# Altium footprint library ref-packages.PCBLIB: 1544 footprints (part 45 of 103) (continued)
## QFP64 [mm] (continued)
  rectangle: -7.25,-9.6 -6.75,-7.55
  rectangle: -8.25,-9.6 -7.75,-7.55
  rectangle: -12.6,5.75 -10.55,6.25
  rectangle: -12.6,4.75 -10.55,5.25
  rectangle: -12.6,3.75 -10.55,4.25
  rectangle: -12.6,2.75 -10.55,3.25
  rectangle: -12.6,1.75 -10.55,2.25
  rectangle: -12.6,0.75 -10.55,1.25
  rectangle: -12.6,-0.25 -10.55,0.25
  rectangle: -12.6,-1.25 -10.55,-0.75
  rectangle: -12.6,-2.25 -10.55,-1.75
  rectangle: -12.6,-3.25 -10.55,-2.75
  rectangle: -12.6,-4.25 -10.55,-3.75
  rectangle: -12.6,-5.25 -10.55,-4.75
  rectangle: -12.6,-6.25 -10.55,-5.75
  rectangle: -9.25,-9.6 -8.75,-7.55
  lines w0.051: -10.5,-6.5 -10,-6.5 ; -9.5,-7.5 -9.5,-7
  lines w0.152: -10.5,-6.5 -9.5,-7.5 10.5,-7.5 10.5,7.5 -10.5,7.5 -10.5,-6.5

## QFP64_SOT319 [mm]
pads (64):
  rect 0.6x1.4 smd: 1(-9,-8.5) 2(-8,-8.5) 3(-7,-8.5) 4(-6,-8.5) 5(-5,-8.5) 6(-4,-8.5) 7(-3,-8.5) 8(-2,-8.5) 9(-1,-8.5) 10(0,-8.5) 11(1,-8.5) 12(2,-8.5) 13(3,-8.5) 14(4,-8.5) 15(5,-8.5) 16(6,-8.5) 17(7,-8.5) 18(8,-8.5) 19(9,-8.5) 33(9,8.5) 34(8,8.5) 35(7,8.5) 36(6,8.5) 37(5,8.5) 38(4,8.5) 39(3,8.5) 40(2,8.5) 41(1,8.5) 42(0,8.5) 43(-1,8.5) 44(-2,8.5) 45(-3,8.5) 46(-4,8.5) 47(-5,8.5) 48(-6,8.5) 49(-7,8.5) 50(-8,8.5) 51(-9,8.5)
  rect 1.4x0.6 smd: 20(11.5,-6) 21(11.5,-5) 22(11.5,-4) 23(11.5,-3) 24(11.5,-2) 25(11.5,-1) 26(11.5,0) 27(11.5,1) 28(11.5,2) 29(11.5,3) 30(11.5,4) 31(11.5,5) 32(11.5,6) 52(-11.5,6) 53(-11.5,5) 54(-11.5,4) 55(-11.5,3) 56(-11.5,2) 57(-11.5,1) 58(-11.5,0) 59(-11.5,-1) 60(-11.5,-2) 61(-11.5,-3) 62(-11.5,-4) 63(-11.5,-5) 64(-11.5,-6)
Top Overlay:
  circle w0.203: c-9,-6 r0.4
  lines w0.203: -10.1,-7.1 10.1,-7.1 10.1,7.1 -10.1,7.1 -10.1,-7.1
Mechanical 16:
  rectangle: -9.2,-8.8 -8.8,-7.15
  rectangle: -8.2,-8.8 -7.8,-7.15
  rectangle: -7.2,-8.8 -6.8,-7.15
  rectangle: -6.2,-8.8 -5.8,-7.15
  rectangle: -5.2,-8.8 -4.8,-7.15
  rectangle: -4.2,-8.8 -3.8,-7.15
  rectangle: -3.2,-8.8 -2.8,-7.15
  rectangle: -2.2,-8.8 -1.8,-7.15
  rectangle: -1.2,-8.8 -0.8,-7.15
  rectangle: -0.2,-8.8 0.2,-7.15
  rectangle: 0.8,-8.8 1.2,-7.15
  rectangle: 1.8,-8.8 2.2,-7.15
  rectangle: 2.8,-8.8 3.2,-7.15
  rectangle: 3.8,-8.8 4.2,-7.15
  rectangle: 4.8,-8.8 5.2,-7.15
  rectangle: 5.8,-8.8 6.2,-7.15
  rectangle: 6.8,-8.8 7.2,-7.15
  rectangle: 7.8,-8.8 8.2,-7.15
  rectangle: 8.8,-8.8 9.2,-7.15
  rectangle: 10.15,-6.2 11.8,-5.8
  rectangle: 10.15,-5.2 11.8,-4.8
  rectangle: 10.15,-4.2 11.8,-3.8
  rectangle: 10.15,-3.2 11.8,-2.8
  rectangle: 10.15,-2.2 11.8,-1.8
  rectangle: 10.15,-1.2 11.8,-0.8
  rectangle: 10.15,-0.2 11.8,0.2
  rectangle: 10.15,0.8 11.8,1.2
  rectangle: 10.15,1.8 11.8,2.2
  rectangle: 10.15,2.8 11.8,3.2
  rectangle: 10.15,3.8 11.8,4.2
  rectangle: 10.15,4.8 11.8,5.2
  rectangle: 10.15,5.8 11.8,6.2
  rectangle: 8.8,7.15 9.2,8.8
  rectangle: 7.8,7.15 8.2,8.8
  rectangle: 6.8,7.15 7.2,8.8
  rectangle: 5.8,7.15 6.2,8.8
  rectangle: 4.8,7.15 5.2,8.8
  rectangle: 3.8,7.15 4.2,8.8
  rectangle: 2.8,7.15 3.2,8.8
  rectangle: 1.8,7.15 2.2,8.8
  rectangle: 0.8,7.15 1.2,8.8
  rectangle: -0.2,7.15 0.2,8.8
  rectangle: -1.2,7.15 -0.8,8.8
  rectangle: -2.2,7.15 -1.8,8.8
  rectangle: -3.2,7.15 -2.8,8.8
  rectangle: -4.2,7.15 -3.8,8.8
  rectangle: -5.2,7.15 -4.8,8.8
  rectangle: -6.2,7.15 -5.8,8.8
  rectangle: -7.2,7.15 -6.8,8.8
  rectangle: -8.2,7.15 -7.8,8.8
  rectangle: -9.2,7.15 -8.8,8.8
  rectangle: -11.8,5.8 -10.15,6.2
  rectangle: -11.8,4.8 -10.15,5.2
  rectangle: -11.8,3.8 -10.15,4.2
  rectangle: -11.8,2.8 -10.15,3.2
  rectangle: -11.8,1.8 -10.15,2.2
  rectangle: -11.8,0.8 -10.15,1.2
  rectangle: -11.8,-0.2 -10.15,0.2
  rectangle: -11.8,-1.2 -10.15,-0.8
  rectangle: -11.8,-2.2 -10.15,-1.8
  rectangle: -11.8,-3.2 -10.15,-2.8
  rectangle: -11.8,-4.2 -10.15,-3.8
  rectangle: -11.8,-5.2 -10.15,-4.8
  rectangle: -11.8,-6.2 -10.15,-5.8

## QFP64_SOT393 [mm]
pads (64):
  rect 0.4x1.4 smd: 1(-6,-8.125) 2(-5.2,-8.125) 3(-4.4,-8.125) 4(-3.6,-8.125) 5(-2.8,-8.125) 6(-2,-8.125) 7(-1.2,-8.125) 8(-0.4,-8.125) 9(0.4,-8.125) 10(1.2,-8.125) 11(2,-8.125) 12(2.8,-8.125) 13(3.6,-8.125) 14(4.4,-8.125) 15(5.2,-8.125) 16(6,-8.125) 33(6,8.125) 34(5.2,8.125) 35(4.4,8.125) 36(3.6,8.125) 37(2.8,8.125) 38(2,8.125) 39(1.2,8.125) 40(0.4,8.125) 41(-0.4,8.125) 42(-1.2,8.125) 43(-2,8.125) 44(-2.8,8.125) 45(-3.6,8.125) 46(-4.4,8.125) 47(-5.2,8.125) 48(-6,8.125)
  rect 1.4x0.4 smd: 17(8.125,-6) 18(8.125,-5.2) 19(8.125,-4.4) 20(8.125,-3.6) 21(8.125,-2.8) 22(8.125,-2) 23(8.125,-1.2) 24(8.125,-0.4) 25(8.125,0.4) 26(8.125,1.2) 27(8.125,2) 28(8.125,2.8) 29(8.125,3.6) 30(8.125,4.4) 31(8.125,5.2) 32(8.125,6) 49(-8.125,6) 50(-8.125,5.2) 51(-8.125,4.4) 52(-8.125,3.6) 53(-8.125,2.8) 54(-8.125,2) 55(-8.125,1.2) 56(-8.125,0.4) 57(-8.125,-0.4) 58(-8.125,-1.2) 59(-8.125,-2) 60(-8.125,-2.8) 61(-8.125,-3.6) 62(-8.125,-4.4) 63(-8.125,-5.2) 64(-8.125,-6)
Top Overlay:
  circle w0.203: c-6,-6 r0.4
  lines w0.203: -7,-7 7,-7 7,7 -7,7 -7,-7
Mechanical 16:
  rectangle: -6.15,-8.6 -5.85,-7.075
  rectangle: -5.35,-8.6 -5.05,-7.075
  rectangle: -4.55,-8.6 -4.25,-7.075
  rectangle: -3.75,-8.6 -3.45,-7.075
  rectangle: -2.95,-8.6 -2.65,-7.075
  rectangle: -2.15,-8.6 -1.85,-7.075
  rectangle: -1.35,-8.6 -1.05,-7.075
  rectangle: -0.55,-8.6 -0.25,-7.075
  rectangle: 0.25,-8.6 0.55,-7.075
  rectangle: 1.05,-8.6 1.35,-7.075
  rectangle: 1.85,-8.6 2.15,-7.075
  rectangle: 2.65,-8.6 2.95,-7.075
  rectangle: 3.45,-8.6 3.75,-7.075
  rectangle: 4.25,-8.6 4.55,-7.075
  rectangle: 5.05,-8.6 5.35,-7.075
  rectangle: 5.85,-8.6 6.15,-7.075
  rectangle: 7.075,-6.15 8.6,-5.85
  rectangle: 7.075,-5.35 8.6,-5.05
  rectangle: 7.075,-4.55 8.6,-4.25
  rectangle: 7.075,-3.75 8.6,-3.45
  rectangle: 7.075,-2.95 8.6,-2.65
  rectangle: 7.075,-2.15 8.6,-1.85
  rectangle: 7.075,-1.35 8.6,-1.05
  rectangle: 7.075,-0.55 8.6,-0.25
  rectangle: 7.075,0.25 8.6,0.55
  rectangle: 7.075,1.05 8.6,1.35
  rectangle: 7.075,1.85 8.6,2.15
  rectangle: 7.075,2.65 8.6,2.95
  rectangle: 7.075,3.45 8.6,3.75
  rectangle: 7.075,4.25 8.6,4.55
  rectangle: 7.075,5.05 8.6,5.35
  rectangle: 7.075,5.85 8.6,6.15
  rectangle: 5.85,7.075 6.15,8.6
  rectangle: 5.05,7.075 5.35,8.6
  rectangle: 4.25,7.075 4.55,8.6
  rectangle: 3.45,7.075 3.75,8.6
  rectangle: 2.65,7.075 2.95,8.6
  rectangle: 1.85,7.075 2.15,8.6
  rectangle: 1.05,7.075 1.35,8.6
  rectangle: 0.25,7.075 0.55,8.6
  rectangle: -0.55,7.075 -0.25,8.6
  rectangle: -1.35,7.075 -1.05,8.6
  rectangle: -2.15,7.075 -1.85,8.6
  rectangle: -2.95,7.075 -2.65,8.6
  rectangle: -3.75,7.075 -3.45,8.6
  rectangle: -4.55,7.075 -4.25,8.6
  rectangle: -5.35,7.075 -5.05,8.6
  rectangle: -6.15,7.075 -5.85,8.6
  rectangle: -8.6,5.85 -7.075,6.15
  rectangle: -8.6,5.05 -7.075,5.35
  rectangle: -8.6,4.25 -7.075,4.55
  rectangle: -8.6,3.45 -7.075,3.75
  rectangle: -8.6,2.65 -7.075,2.95
  rectangle: -8.6,1.85 -7.075,2.15
  rectangle: -8.6,1.05 -7.075,1.35
  rectangle: -8.6,0.25 -7.075,0.55
  rectangle: -8.6,-0.55 -7.075,-0.25
  rectangle: -8.6,-1.35 -7.075,-1.05
  rectangle: -8.6,-2.15 -7.075,-1.85
  rectangle: -8.6,-2.95 -7.075,-2.65
  rectangle: -8.6,-3.75 -7.075,-3.45
  rectangle: -8.6,-4.55 -7.075,-4.25
  rectangle: -8.6,-5.35 -7.075,-5.05
  rectangle: -8.6,-6.15 -7.075,-5.85

## QFP80 [mm]
pads (80):
  rect 0.35x1.9 smd: 1(-8.8,-7.53) 2(-8,-7.53) 3(-7.2,-7.53) 4(-6.4,-7.53) 5(-5.6,-7.53) 6(-4.8,-7.53) 7(-4,-7.53) 8(-3.2,-7.53) 9(-2.4,-7.53) 10(-1.6,-7.53) 11(-0.8,-7.53) 12(0,-7.53) 13(0.8,-7.53) 14(1.6,-7.53) 15(2.4,-7.53) 16(3.2,-7.53) 17(4,-7.53) 18(4.8,-7.53) 19(5.6,-7.53) 20(6.4,-7.53) 21(7.2,-7.53) 22(8,-7.53) 23(8.8,-7.53) 24(9.6,-7.53) 41(9.6,8.47) 42(8.8,8.47) 43(8,8.47) 44(7.2,8.47) 45(6.4,8.47) 46(5.6,8.47) 47(4.8,8.47) 48(4,8.47) 49(3.2,8.47) 50(2.4,8.47) 51(1.6,8.47) 52(0.8,8.47) 53(0,8.47) 54(-0.8,8.47) 55(-1.6,8.47) 56(-2.4,8.47) 57(-3.2,8.47) 58(-4,8.47) 59(-4.8,8.47) 60(-5.6,8.47) 61(-6.4,8.47) 62(-7.2,8.47) 63(-8,8.47) 64(-8.8,8.47)
  rect 1.9x0.35 smd: 25(11.4,-5.53) 26(11.4,-4.73) 27(11.4,-3.93) 28(11.4,-3.13) 29(11.4,-2.33) 30(11.4,-1.53) 31(11.4,-0.73) 32(11.4,0.07) 33(11.4,0.87) 34(11.4,1.67) 35(11.4,2.47) 36(11.4,3.27) 37(11.4,4.07) 38(11.4,4.87) 39(11.4,5.67) 40(11.4,6.47) 65(-10.6,6.47) 66(-10.6,5.67) 67(-10.6,4.87) 68(-10.6,4.07) 69(-10.6,3.27) 70(-10.6,2.47) 71(-10.6,1.67) 72(-10.6,0.87) 73(-10.6,0.07) 74(-10.6,-0.73) 75(-10.6,-1.53) 76(-10.6,-2.33) 77(-10.6,-3.13) 78(-10.6,-3.93) 79(-10.6,-4.73) 80(-10.6,-5.53)
Top Overlay:
  circle w0.152: c-7.06,-3.92 r1
  rectangle: -8.975,7.52 -8.625,9.42
  rectangle: 9.425,-8.48 9.775,-6.58
  rectangle: -8.175,7.52 -7.825,9.42
  rectangle: -7.375,7.52 -7.025,9.42
  rectangle: -6.575,7.52 -6.225,9.42
  rectangle: -5.775,7.52 -5.425,9.42
  rectangle: -4.975,7.52 -4.625,9.42
  rectangle: -4.175,7.52 -3.825,9.42
  rectangle: -3.375,7.52 -3.025,9.42
  rectangle: -2.575,7.52 -2.225,9.42
  rectangle: -1.775,7.52 -1.425,9.42
  rectangle: -0.975,7.52 -0.625,9.42
  rectangle: -0.175,7.52 0.175,9.42
  rectangle: 0.625,7.52 0.975,9.42
  rectangle: 1.425,7.52 1.775,9.42
  rectangle: 2.225,7.52 2.575,9.42
  rectangle: 3.025,7.52 3.375,9.42
  rectangle: 3.825,7.52 4.175,9.42
  rectangle: 4.625,7.52 4.975,9.42
  rectangle: 5.425,7.52 5.775,9.42
  rectangle: 6.225,7.52 6.575,9.42
  rectangle: 7.025,7.52 7.375,9.42
  rectangle: 7.825,7.52 8.175,9.42
  rectangle: 8.625,7.52 8.975,9.42
  rectangle: 9.425,7.52 9.775,9.42
  rectangle: -8.975,-8.48 -8.625,-6.58
  rectangle: -8.175,-8.48 -7.825,-6.58
  rectangle: -7.375,-8.48 -7.025,-6.58
  rectangle: -6.575,-8.48 -6.225,-6.58
  rectangle: -5.775,-8.48 -5.425,-6.58
  rectangle: -4.975,-8.48 -4.625,-6.58
  rectangle: -4.175,-8.48 -3.825,-6.58
  rectangle: -3.375,-8.48 -3.025,-6.58
  rectangle: -2.575,-8.48 -2.225,-6.58
  rectangle: -1.775,-8.48 -1.425,-6.58
  rectangle: -0.975,-8.48 -0.625,-6.58
  rectangle: -0.175,-8.48 0.175,-6.58
  rectangle: 0.625,-8.48 0.975,-6.58
  rectangle: 1.425,-8.48 1.775,-6.58
  rectangle: 2.225,-8.48 2.575,-6.58
  rectangle: 3.825,-8.48 4.175,-6.58
  rectangle: 3.025,-8.48 3.375,-6.58
  rectangle: 4.625,-8.48 4.975,-6.58
  rectangle: 5.425,-8.48 5.775,-6.58
  rectangle: 6.225,-8.48 6.575,-6.58
  rectangle: 7.025,-8.48 7.375,-6.58
  rectangle: 7.825,-8.48 8.175,-6.58
  rectangle: 8.625,-8.48 8.975,-6.58
  rectangle: 10.45,-0.105 12.35,0.245
  rectangle: -11.55,-5.705 -9.65,-5.355
  rectangle: 10.45,0.695 12.35,1.045
  rectangle: 10.45,1.495 12.35,1.845
  rectangle: 10.45,2.295 12.35,2.645
  rectangle: 10.45,3.095 12.35,3.445
  rectangle: 10.45,3.895 12.35,4.245
  rectangle: 10.45,4.695 12.35,5.045
  rectangle: 10.45,5.495 12.35,5.845
  rectangle: 10.45,6.295 12.35,6.645
  rectangle: 10.45,-0.905 12.35,-0.555
  rectangle: 10.45,-1.705 12.35,-1.355
  rectangle: 10.45,-2.505 12.35,-2.155
  rectangle: 10.45,-3.305 12.35,-2.955
  rectangle: 10.45,-4.105 12.35,-3.755
  rectangle: 10.45,-4.905 12.35,-4.555
  rectangle: 10.45,-5.705 12.35,-5.355
  rectangle: -11.55,6.295 -9.65,6.645
  rectangle: -11.55,5.495 -9.65,5.845
  rectangle: -11.55,4.695 -9.65,5.045
  rectangle: -11.55,3.895 -9.65,4.245
  rectangle: -11.55,3.095 -9.65,3.445
  rectangle: -11.55,2.295 -9.65,2.645
  rectangle: -11.55,1.495 -9.65,1.845
  rectangle: -11.55,0.695 -9.65,1.045
  rectangle: -11.55,-0.105 -9.65,0.245
  rectangle: -11.55,-0.905 -9.65,-0.555
  rectangle: -11.55,-1.705 -9.65,-1.355
  rectangle: -11.55,-2.505 -9.65,-2.155
  rectangle: -11.55,-3.305 -9.65,-2.955
  rectangle: -11.55,-4.105 -9.65,-3.755
  rectangle: -11.55,-4.905 -9.65,-4.555
  lines w0.152: -9.2,5.47 -9.2,5.67 ; -9.6,-5.93 -9,-6.53 ; -9.6,-5.93 -9.6,6.87 ; -9.6,-5.93 -9.2,-5.73 ; -9.6,6.87 -9,7.47 ; -9.6,6.87 -9.2,6.67 ; -9.2,-5.73 -8.8,-6.13 ; -9.2,-5.73 -9.2,5.67 ; -9.2,5.67 -9.2,6.67 ; -9.2,6.67 -8.8,7.07 ; -9,-6.53 9.8,-6.53 ; -9,-6.53 -8.8,-6.13 ; -9,7.47 9.8,7.47 ; -9,7.47 -8.8,7.07 ; -8.8,-6.13 9.6,-6.13 ; -8.8,7.07 9.6,7.07 ; 9.6,-6.13 10,-5.73 ; 9.6,-6.13 9.8,-6.53 ; 9.6,7.07 10,6.67 ; 9.6,7.07 9.8,7.47 ; 9.8,-6.53 10.4,-5.93 ; 9.8,7.47 10.4,6.87 ; 10,-5.73 10,6.67 ; 10,-5.73 10.4,-5.93 ; 10,6.67 10.4,6.87 ; 10.4,-5.93 10.4,6.87

## QFP80-841 [mm]
pads (80):
  rect 1.2x0.4 smd: 1(-8.3,6.175) 2(-8.3,5.525) 3(-8.3,4.875) 4(-8.3,4.225) 5(-8.3,3.575) 6(-8.3,2.925) 7(-8.3,2.275) 8(-8.3,1.625) 9(-8.3,0.975) 10(-8.3,0.325) 11(-8.3,-0.325) 12(-8.3,-0.975) 13(-8.3,-1.625) 14(-8.3,-2.275) 15(-8.3,-2.925) 16(-8.3,-3.575) 17(-8.3,-4.225) 18(-8.3,-4.875) 19(-8.3,-5.525) 20(-8.3,-6.175) 41(8.3,-6.175) 42(8.3,-5.525) 43(8.3,-4.875) 44(8.3,-4.225) 45(8.3,-3.575) 46(8.3,-2.925) 47(8.3,-2.275) 48(8.3,-1.625) 49(8.3,-0.975) 50(8.3,-0.325) 51(8.3,0.325) 52(8.3,0.975) 53(8.3,1.625) 54(8.3,2.275) 55(8.3,2.925) 56(8.3,3.575) 57(8.3,4.225) 58(8.3,4.875) 59(8.3,5.525) 60(8.3,6.175)
  rect 0.4x1.2 smd: 21(-6.175,-8.3) 22(-5.525,-8.3) 23(-4.875,-8.3) 24(-4.225,-8.3) 25(-3.575,-8.3) 26(-2.925,-8.3) 27(-2.275,-8.3) 28(-1.625,-8.3) 29(-0.975,-8.3) 30(-0.325,-8.3) 31(0.325,-8.3) 32(0.975,-8.3) 33(1.625,-8.3) 34(2.275,-8.3) 35(2.925,-8.3) 36(3.575,-8.3) 37(4.225,-8.3) 38(4.875,-8.3) 39(5.525,-8.3) 40(6.175,-8.3) 61(6.175,8.3) 62(5.525,8.3) 63(4.875,8.3) 64(4.225,8.3) 65(3.575,8.3) 66(2.925,8.3) 67(2.275,8.3) 68(1.625,8.3) 69(0.975,8.3) 70(0.325,8.3) 71(-0.325,8.3) 72(-0.975,8.3) 73(-1.625,8.3) 74(-2.275,8.3) 75(-2.925,8.3) 76(-3.575,8.3) 77(-4.225,8.3) 78(-4.875,8.3) 79(-5.525,8.3) 80(-6.175,8.3)
Top Overlay:
  circle w0.152: c-6.15,6.1 r0.354
  lines w0.152: -6.98,-6.98 6.98,-6.98 6.98,6.98 -6.43,6.98 -6.98,6.43 -6.98,-6.98
Mechanical 16:
  rectangle: -8.7,6 -7.02,6.35
  rectangle: -8.7,5.35 -7.02,5.7
  rectangle: -8.7,4.7 -7.02,5.05
  rectangle: -8.7,4.05 -7.02,4.4
  rectangle: -8.7,3.4 -7.02,3.75
  rectangle: -8.7,2.75 -7.02,3.1
  rectangle: -8.7,2.1 -7.02,2.45
  rectangle: -8.7,1.45 -7.02,1.8
  rectangle: -8.7,0.8 -7.02,1.15
  rectangle: -8.7,0.15 -7.02,0.5
  rectangle: -8.7,-0.5 -7.02,-0.15
  rectangle: -8.7,-1.15 -7.02,-0.8
  rectangle: -8.7,-1.8 -7.02,-1.45
  rectangle: -8.7,-2.45 -7.02,-2.1
  rectangle: -8.7,-3.1 -7.02,-2.75
  rectangle: -8.7,-3.75 -7.02,-3.4
  rectangle: -8.7,-4.4 -7.02,-4.05
  rectangle: -8.7,-5.05 -7.02,-4.7
  rectangle: -8.7,-5.7 -7.02,-5.35
  rectangle: -8.7,-6.35 -7.02,-6
  rectangle: -6.35,-8.7 -6,-7.02
  rectangle: -5.7,-8.7 -5.35,-7.02
  rectangle: -5.05,-8.7 -4.7,-7.02
  rectangle: -4.4,-8.7 -4.05,-7.02
  rectangle: -3.75,-8.7 -3.4,-7.02
  rectangle: -3.1,-8.7 -2.75,-7.02
  rectangle: -2.45,-8.7 -2.1,-7.02
  rectangle: -1.8,-8.7 -1.45,-7.02
  rectangle: -1.15,-8.7 -0.8,-7.02
  rectangle: -0.5,-8.7 -0.15,-7.02
  rectangle: 0.15,-8.7 0.5,-7.02
  rectangle: 0.8,-8.7 1.15,-7.02
  rectangle: 1.45,-8.7 1.8,-7.02
  rectangle: 2.1,-8.7 2.45,-7.02
  rectangle: 2.75,-8.7 3.1,-7.02
  rectangle: 3.4,-8.7 3.75,-7.02
  rectangle: 4.05,-8.7 4.4,-7.02
  rectangle: 4.7,-8.7 5.05,-7.02
  rectangle: 5.35,-8.7 5.7,-7.02
  rectangle: 6,-8.7 6.35,-7.02
  rectangle: 7.02,-6.35 8.7,-6
  rectangle: 7.02,-5.7 8.7,-5.35
  rectangle: 7.02,-5.05 8.7,-4.7
  rectangle: 7.02,-4.4 8.7,-4.05
  rectangle: 7.02,-3.75 8.7,-3.4
  rectangle: 7.02,-3.1 8.7,-2.75
  rectangle: 7.02,-2.45 8.7,-2.1
  rectangle: 7.02,-1.8 8.7,-1.45
  rectangle: 7.02,-1.15 8.7,-0.8
  rectangle: 7.02,-0.5 8.7,-0.15
  rectangle: 7.02,0.15 8.7,0.5
  rectangle: 7.02,0.8 8.7,1.15
  rectangle: 7.02,1.45 8.7,1.8
  rectangle: 7.02,2.1 8.7,2.45
  rectangle: 7.02,2.75 8.7,3.1
  rectangle: 7.02,3.4 8.7,3.75
  rectangle: 7.02,4.05 8.7,4.4
  rectangle: 7.02,4.7 8.7,5.05
  rectangle: 7.02,5.35 8.7,5.7
  rectangle: 7.02,6 8.7,6.35
  rectangle: 6,7.02 6.35,8.7
  rectangle: 5.35,7.02 5.7,8.7
  rectangle: 4.7,7.02 5.05,8.7
  rectangle: 4.05,7.02 4.4,8.7
  rectangle: 3.4,7.02 3.75,8.7
  rectangle: 2.75,7.02 3.1,8.7
  rectangle: 2.1,7.02 2.45,8.7
  rectangle: 1.45,7.02 1.8,8.7
  rectangle: 0.8,7.02 1.15,8.7
  rectangle: 0.15,7.02 0.5,8.7
  rectangle: -0.5,7.02 -0.15,8.7
  rectangle: -1.15,7.02 -0.8,8.7
  rectangle: -1.8,7.02 -1.45,8.7
  rectangle: -2.45,7.02 -2.1,8.7
  rectangle: -3.1,7.02 -2.75,8.7
  rectangle: -3.75,7.02 -3.4,8.7
  rectangle: -4.4,7.02 -4.05,8.7
  rectangle: -5.05,7.02 -4.7,8.7
  rectangle: -5.7,7.02 -5.35,8.7
  rectangle: -6.35,7.02 -6,8.7

## QFP80_SOT310-1 [mm]
pads (80):
  rect 0.4x1.4 smd: 1(-9.2,-8.2) 2(-8.4,-8.2) 3(-7.6,-8.2) 4(-6.8,-8.2) 5(-6,-8.2) 6(-5.2,-8.2) 7(-4.4,-8.2) 8(-3.6,-8.2) 9(-2.8,-8.2) 10(-2,-8.2) 11(-1.2,-8.2) 12(-0.4,-8.2) 13(0.4,-8.2) 14(1.2,-8.2) 15(2,-8.2) 16(2.8,-8.2) 17(3.6,-8.2) 18(4.4,-8.2) 19(5.2,-8.2) 20(6,-8.2) 21(6.8,-8.2) 22(7.6,-8.2) 23(8.4,-8.2) 24(9.2,-8.2) 41(9.2,8.2) 42(8.4,8.2) 43(7.6,8.2) 44(6.8,8.2) 45(6,8.2) 46(5.2,8.2) 47(4.4,8.2) 48(3.6,8.2) 49(2.8,8.2) 50(2,8.2) 51(1.2,8.2) 52(0.4,8.2) 53(-0.4,8.2) 54(-1.2,8.2) 55(-2,8.2) 56(-2.8,8.2) 57(-3.6,8.2) 58(-4.4,8.2) 59(-5.2,8.2) 60(-6,8.2) 61(-6.8,8.2) 62(-7.6,8.2) 63(-8.4,8.2) 64(-9.2,8.2)
  rect 1.4x0.4 smd: 25(11.1,-6) 26(11.1,-5.2) 27(11.1,-4.4) 28(11.1,-3.6) 29(11.1,-2.8) 30(11.1,-2) 31(11.1,-1.2) 32(11.1,-0.4) 33(11.1,0.4) 34(11.1,1.2) 35(11.1,2) 36(11.1,2.8) 37(11.1,3.6) 38(11.1,4.4) 39(11.1,5.2) 40(11.1,6) 65(-11.1,6) 66(-11.1,5.2) 67(-11.1,4.4) 68(-11.1,3.6) 69(-11.1,2.8) 70(-11.1,2) 71(-11.1,1.2) 72(-11.1,0.4) 73(-11.1,-0.4) 74(-11.1,-1.2) 75(-11.1,-2) 76(-11.1,-2.8) 77(-11.1,-3.6) 78(-11.1,-4.4) 79(-11.1,-5.2) 80(-11.1,-6)
Top Overlay:
  circle w0.203: c-9.2,-6 r0.4
  lines w0.203: -10,-7 10,-7 10,7 -10,7 -10,-7
Mechanical 16:
  rectangle: -9.35,-8.65 -9.05,-7.05
  rectangle: -8.55,-8.65 -8.25,-7.05
  rectangle: -7.75,-8.65 -7.45,-7.05
  rectangle: -6.95,-8.65 -6.65,-7.05
  rectangle: -6.15,-8.65 -5.85,-7.05
  rectangle: -5.35,-8.65 -5.05,-7.05
  rectangle: -4.55,-8.65 -4.25,-7.05
  rectangle: -3.75,-8.65 -3.45,-7.05
  rectangle: -2.95,-8.65 -2.65,-7.05
  rectangle: -2.15,-8.65 -1.85,-7.05
  rectangle: -1.35,-8.65 -1.05,-7.05
  rectangle: -0.55,-8.65 -0.25,-7.05
  rectangle: 0.25,-8.65 0.55,-7.05
  rectangle: 1.05,-8.65 1.35,-7.05
  rectangle: 1.85,-8.65 2.15,-7.05
  rectangle: 2.65,-8.65 2.95,-7.05
  rectangle: 3.45,-8.65 3.75,-7.05
  rectangle: 4.25,-8.65 4.55,-7.05
  rectangle: 5.05,-8.65 5.35,-7.05
  rectangle: 5.85,-8.65 6.15,-7.05
  rectangle: 6.65,-8.65 6.95,-7.05
  rectangle: 7.45,-8.65 7.75,-7.05
  rectangle: 8.25,-8.65 8.55,-7.05
  rectangle: 9.05,-8.65 9.35,-7.05
  rectangle: 9.95,-6.15 11.55,-5.85
  rectangle: 9.95,-5.35 11.55,-5.05
  rectangle: 9.95,-4.55 11.55,-4.25
  rectangle: 9.95,-3.75 11.55,-3.45
  rectangle: 9.95,-2.95 11.55,-2.65
  rectangle: 9.95,-2.15 11.55,-1.85
  rectangle: 9.95,-1.35 11.55,-1.05
  rectangle: 9.95,-0.55 11.55,-0.25
  rectangle: 9.95,0.25 11.55,0.55
  rectangle: 9.95,1.05 11.55,1.35
  rectangle: 9.95,1.85 11.55,2.15
  rectangle: 9.95,2.65 11.55,2.95
  rectangle: 9.95,3.45 11.55,3.75
  rectangle: 9.95,4.25 11.55,4.55
  rectangle: 9.95,5.05 11.55,5.35
  rectangle: 9.95,5.85 11.55,6.15
  rectangle: 9.05,7.05 9.35,8.65
  rectangle: 8.25,7.05 8.55,8.65
  rectangle: 7.45,7.05 7.75,8.65
  rectangle: 6.65,7.05 6.95,8.65
  rectangle: 5.85,7.05 6.15,8.65
  rectangle: 5.05,7.05 5.35,8.65
  rectangle: 4.25,7.05 4.55,8.65
  rectangle: 3.45,7.05 3.75,8.65
  rectangle: 2.65,7.05 2.95,8.65
  rectangle: 1.85,7.05 2.15,8.65
  rectangle: 1.05,7.05 1.35,8.65
  rectangle: 0.25,7.05 0.55,8.65
  rectangle: -0.55,7.05 -0.25,8.65
  rectangle: -1.35,7.05 -1.05,8.65
  rectangle: -2.15,7.05 -1.85,8.65
  rectangle: -2.95,7.05 -2.65,8.65
  rectangle: -3.75,7.05 -3.45,8.65
  rectangle: -4.55,7.05 -4.25,8.65
  rectangle: -5.35,7.05 -5.05,8.65
  rectangle: -6.15,7.05 -5.85,8.65
  rectangle: -6.95,7.05 -6.65,8.65
  rectangle: -7.75,7.05 -7.45,8.65
  rectangle: -8.55,7.05 -8.25,8.65
  rectangle: -9.35,7.05 -9.05,8.65
  rectangle: -11.55,5.85 -9.95,6.15
  rectangle: -11.55,5.05 -9.95,5.35
  rectangle: -11.55,4.25 -9.95,4.55
  rectangle: -11.55,3.45 -9.95,3.75
  rectangle: -11.55,2.65 -9.95,2.95
  rectangle: -11.55,1.85 -9.95,2.15
  rectangle: -11.55,1.05 -9.95,1.35
  rectangle: -11.55,0.25 -9.95,0.55
  rectangle: -11.55,-0.55 -9.95,-0.25
  rectangle: -11.55,-1.35 -9.95,-1.05
  rectangle: -11.55,-2.15 -9.95,-1.85
  rectangle: -11.55,-2.95 -9.95,-2.65
  rectangle: -11.55,-3.75 -9.95,-3.45
  rectangle: -11.55,-4.55 -9.95,-4.25
  rectangle: -11.55,-5.35 -9.95,-5.05
  rectangle: -11.55,-6.15 -9.95,-5.85

## QFP80_SOT318 [mm]
pads (80):
  rect 0.4x1.4 smd: 1(-9.2,-8.5) 2(-8.4,-8.5) 3(-7.6,-8.5) 4(-6.8,-8.5) 5(-6,-8.5) 6(-5.2,-8.5) 7(-4.4,-8.5) 8(-3.6,-8.5) 9(-2.8,-8.5) 10(-2,-8.5) 11(-1.2,-8.5) 12(-0.4,-8.5) 13(0.4,-8.5) 14(1.2,-8.5) 15(2,-8.5) 16(2.8,-8.5) 17(3.6,-8.5) 18(4.4,-8.5) 19(5.2,-8.5) 20(6,-8.5) 21(6.8,-8.5) 22(7.6,-8.5) 23(8.4,-8.5) 24(9.2,-8.5) 41(9.2,8.5) 42(8.4,8.5) 43(7.6,8.5) 44(6.8,8.5) 45(6,8.5) 46(5.2,8.5) 47(4.4,8.5) 48(3.6,8.5) 49(2.8,8.5) 50(2,8.5) 51(1.2,8.5) 52(0.4,8.5) 53(-0.4,8.5) 54(-1.2,8.5) 55(-2,8.5) 56(-2.8,8.5) 57(-3.6,8.5) 58(-4.4,8.5) 59(-5.2,8.5) 60(-6,8.5) 61(-6.8,8.5) 62(-7.6,8.5) 63(-8.4,8.5) 64(-9.2,8.5)
  rect 1.4x0.4 smd: 25(11.5,-6) 26(11.5,-5.2) 27(11.5,-4.4) 28(11.5,-3.6) 29(11.5,-2.8) 30(11.5,-2) 31(11.5,-1.2) 32(11.5,-0.4) 33(11.5,0.4) 34(11.5,1.2) 35(11.5,2) 36(11.5,2.8) 37(11.5,3.6) 38(11.5,4.4) 39(11.5,5.2) 40(11.5,6) 65(-11.5,6) 66(-11.5,5.2) 67(-11.5,4.4) 68(-11.5,3.6) 69(-11.5,2.8) 70(-11.5,2) 71(-11.5,1.2) 72(-11.5,0.4) 73(-11.5,-0.4) 74(-11.5,-1.2) 75(-11.5,-2) 76(-11.5,-2.8) 77(-11.5,-3.6) 78(-11.5,-4.4) 79(-11.5,-5.2) 80(-11.5,-6)
Top Overlay:
  circle w0.203: c-9.2,-6 r0.4
  lines w0.203: -10.1,-7 10.1,-7 10.1,7 -10.1,7 -10.1,-7
Mechanical 16:
  rectangle: -9.35,-8.65 -9.05,-7.05
  rectangle: -8.55,-8.65 -8.25,-7.05
  rectangle: -7.75,-8.65 -7.45,-7.05
  rectangle: -6.95,-8.65 -6.65,-7.05
  rectangle: -6.15,-8.65 -5.85,-7.05
  rectangle: -5.35,-8.65 -5.05,-7.05
  rectangle: -4.55,-8.65 -4.25,-7.05
  rectangle: -3.75,-8.65 -3.45,-7.05
  rectangle: -2.95,-8.65 -2.65,-7.05
  rectangle: -2.15,-8.65 -1.85,-7.05
  rectangle: -1.35,-8.65 -1.05,-7.05
  rectangle: -0.55,-8.65 -0.25,-7.05
  rectangle: 0.25,-8.65 0.55,-7.05
  rectangle: 1.05,-8.65 1.35,-7.05
  rectangle: 1.85,-8.65 2.15,-7.05
  rectangle: 2.65,-8.65 2.95,-7.05
  rectangle: 3.45,-8.65 3.75,-7.05
  rectangle: 4.25,-8.65 4.55,-7.05
  rectangle: 5.05,-8.65 5.35,-7.05
  rectangle: 5.85,-8.65 6.15,-7.05
  rectangle: 6.65,-8.65 6.95,-7.05
  rectangle: 7.45,-8.65 7.75,-7.05
  rectangle: 8.25,-8.65 8.55,-7.05
  rectangle: 9.05,-8.65 9.35,-7.05
  rectangle: 10.05,-6.15 11.65,-5.85
  rectangle: 10.05,-5.35 11.65,-5.05
  rectangle: 10.05,-4.55 11.65,-4.25
  rectangle: 10.05,-3.75 11.65,-3.45
  rectangle: 10.05,-2.95 11.65,-2.65
  rectangle: 10.05,-2.15 11.65,-1.85
  rectangle: 10.05,-1.35 11.65,-1.05
  rectangle: 10.05,-0.55 11.65,-0.25
  rectangle: 10.05,0.25 11.65,0.55
  rectangle: 10.05,1.05 11.65,1.35
  rectangle: 10.05,1.85 11.65,2.15
  rectangle: 10.05,2.65 11.65,2.95
  rectangle: 10.05,3.45 11.65,3.75
  rectangle: 10.05,4.25 11.65,4.55
  rectangle: 10.05,5.05 11.65,5.35
  rectangle: 10.05,5.85 11.65,6.15
  rectangle: 9.05,7.05 9.35,8.65
  rectangle: 8.25,7.05 8.55,8.65
  rectangle: 7.45,7.05 7.75,8.65
  rectangle: 6.65,7.05 6.95,8.65
  rectangle: 5.85,7.05 6.15,8.65
  rectangle: 5.05,7.05 5.35,8.65
  rectangle: 4.25,7.05 4.55,8.65
  rectangle: 3.45,7.05 3.75,8.65
  rectangle: 2.65,7.05 2.95,8.65
  rectangle: 1.85,7.05 2.15,8.65
  rectangle: 1.05,7.05 1.35,8.65
  rectangle: 0.25,7.05 0.55,8.65
  rectangle: -0.55,7.05 -0.25,8.65
  rectangle: -1.35,7.05 -1.05,8.65
  rectangle: -2.15,7.05 -1.85,8.65
  rectangle: -2.95,7.05 -2.65,8.65
  rectangle: -3.75,7.05 -3.45,8.65
  rectangle: -4.55,7.05 -4.25,8.65
  rectangle: -5.35,7.05 -5.05,8.65
  rectangle: -6.15,7.05 -5.85,8.65
  rectangle: -6.95,7.05 -6.65,8.65
  rectangle: -7.75,7.05 -7.45,8.65
  rectangle: -8.55,7.05 -8.25,8.65
  rectangle: -9.35,7.05 -9.05,8.65
  rectangle: -11.65,5.85 -10.05,6.15
  rectangle: -11.65,5.05 -10.05,5.35
  rectangle: -11.65,4.25 -10.05,4.55
  rectangle: -11.65,3.45 -10.05,3.75
  rectangle: -11.65,2.65 -10.05,2.95
  rectangle: -11.65,1.85 -10.05,2.15
  rectangle: -11.65,1.05 -10.05,1.35
  rectangle: -11.65,0.25 -10.05,0.55
  rectangle: -11.65,-0.55 -10.05,-0.25
  rectangle: -11.65,-1.35 -10.05,-1.05
  rectangle: -11.65,-2.15 -10.05,-1.85
  rectangle: -11.65,-2.95 -10.05,-2.65
  rectangle: -11.65,-3.75 -10.05,-3.45
  rectangle: -11.65,-4.55 -10.05,-4.25
  rectangle: -11.65,-5.35 -10.05,-5.05
  rectangle: -11.65,-6.15 -10.05,-5.85